# Altium footprint library 总库.PcbLib: 264 footprints (part 1 of 17)
Each footprint in its own frame and in the unit in brackets; x right, y up, seen from the top. Pads: shape width x height; smd on the part's side, far side on the other; paste and mask are expansions set on the pad; w line width, h text height; cw(c..) or ccw(c..) is an arc to the next point about the centre after c.
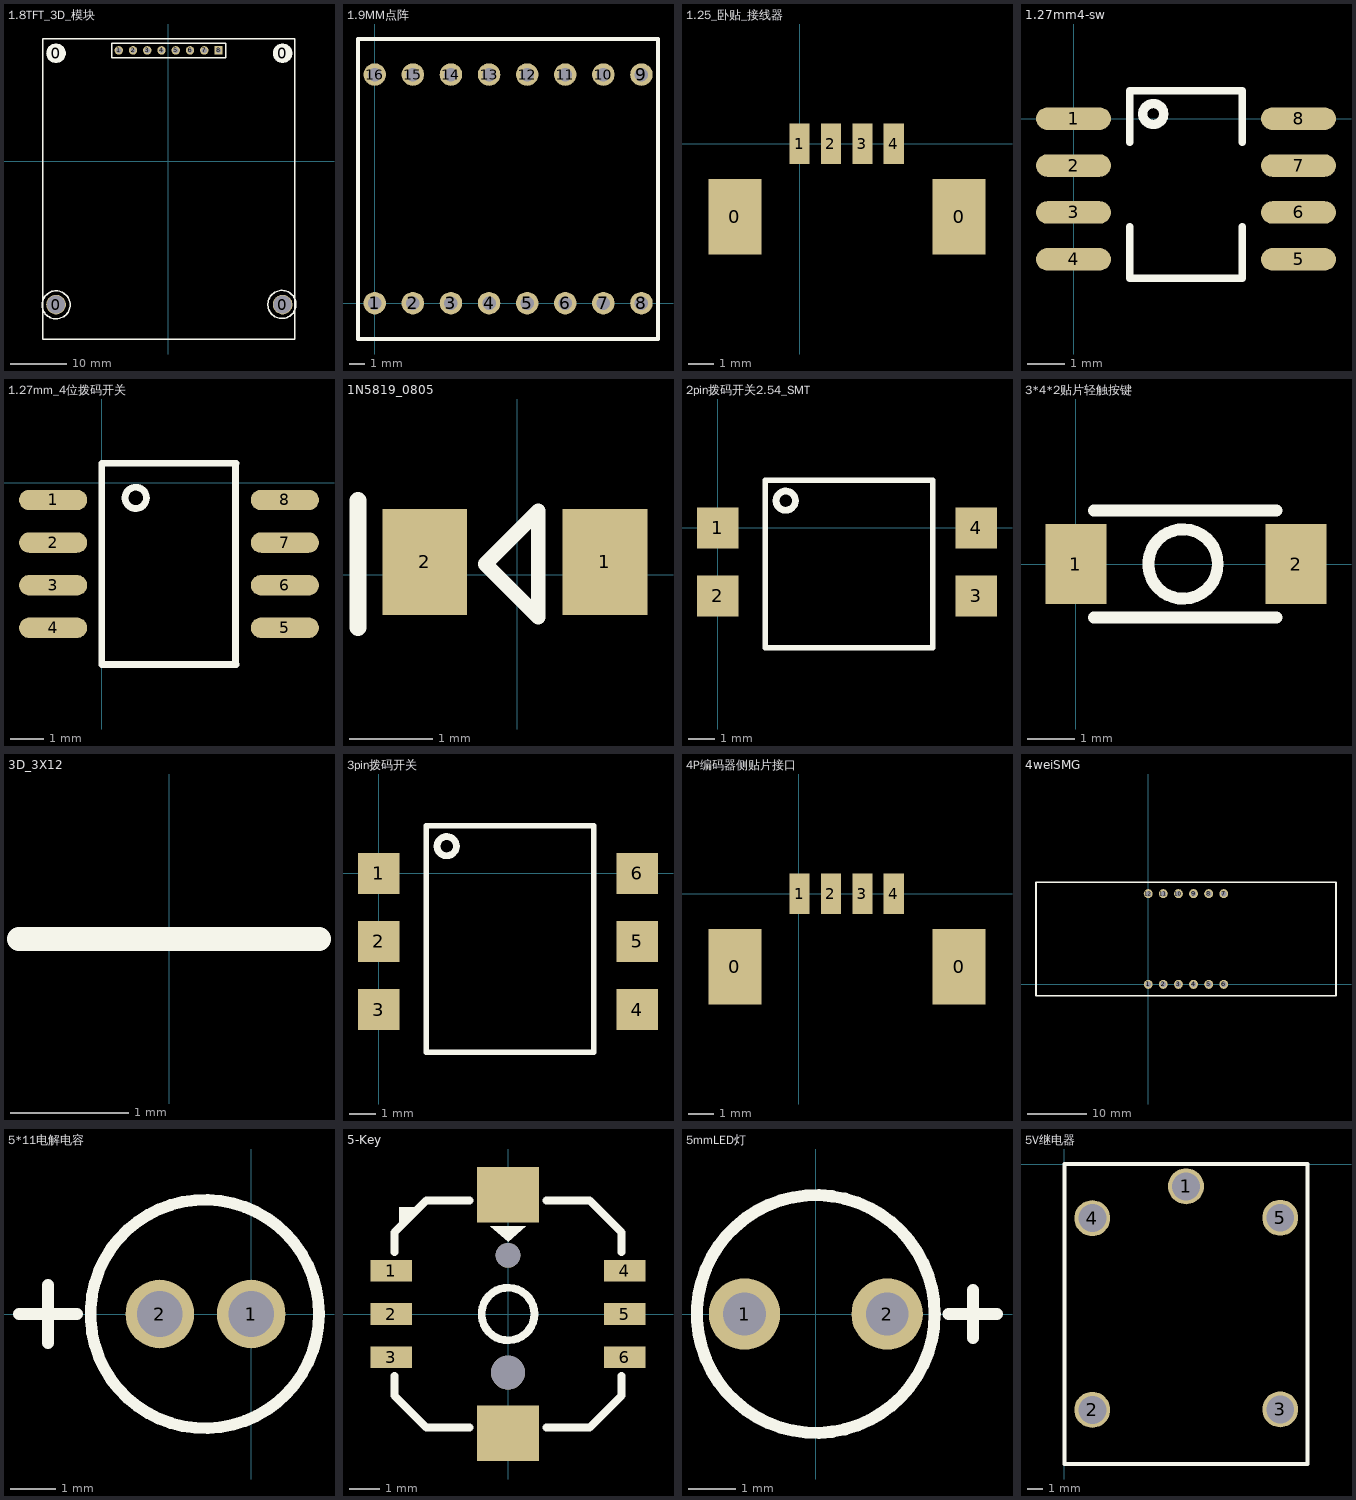
[diagram p0: the footprints below, top view; thin cyan lines are the x and y axes]

## 1.8TFT_3D_模块 [mm]
pads (12):
  round 3.5 hole 3.2: 0(-19.964,-25.572) 0(20.426,-25.572)
  round 3.5 on Top Overlay: 0(-19.964,19.228) 0(20.426,19.228)
  round 1.5 hole 0.9: 1(-8.788,19.736) 2(-6.248,19.736) 3(-3.708,19.736) 4(-1.168,19.736) 5(1.372,19.736) 6(3.912,19.736) 7(6.452,19.736)
  rect 1.5x1.5 hole 0.9: 8(8.992,19.736)
Top Overlay:
  circle w0.254: c20.295,-25.54 r2.5
  circle w0.254: c-19.964,-25.616 r2.5
  lines w0.254: -22.377,-31.702 -22.377,21.768 22.583,21.768 22.583,-31.702 -22.377,-31.702 ; -10.058,18.466 -10.058,21.006 10.262,21.006 10.262,18.466 -10.058,18.466
3D body: height 7.06, standoff 0.06, extent 17.715,-27.805 22.911,-23.305
3D body: height 10.5, standoff 4.13, extent 17.495,-28.34 23.095,-22.74
3D body: height 10.11, standoff -1.43, extent 5.156,18.44 10.236,20.93
3D body: height 10.11, standoff -1.43, extent 0.076,18.44 5.156,20.93
3D body: height 10.11, standoff -1.43, extent -5.004,18.44 0.076,20.93
3D body: height 10.11, standoff -1.43, extent -10.084,18.44 -5.004,20.93
3D body: height 9.27, standoff 7.87, extent -10.058,18.466 10.261,21.005
3D body: height 7.87, standoff 7.11, extent -22.504,-31.829 22.71,21.895
3D body: height 9.14, standoff 7.87, extent -16.916,-28.27 17.338,17.814
3D body: height 9.27, standoff 7.87, extent -1.795,-26.365 2.253,-22.309
3D body: height 9.27, standoff 7.87, extent -14.503,-19.761 15.087,15.671
3D body: height 10.5, standoff 4.13, extent -22.764,-28.416 -17.164,-22.816
3D body: height 7.06, standoff 0.06, extent -22.544,-27.881 -17.348,-23.381

## 1.9MM点阵 [mm]
pads (16):
  round 1.5 hole 0.9: 1(0,0) 2(2.54,0) 3(5.08,0) 4(7.62,0) 5(10.16,0) 6(12.7,0) 7(15.24,0) 8(17.78,0) 9(17.78,15.24) 10(15.24,15.24) 11(12.7,15.24) 12(10.16,15.24) 13(7.62,15.24) 14(5.08,15.24) 15(2.54,15.24) 16(0,15.24)
Top Overlay:
  lines w0.254: -1.118,-2.388 18.882,-2.388 18.882,17.612 -1.118,17.612 -1.118,-2.388
3D body: height 6, standoff -5, extent -1.245,-2.515 18.755,17.485

## 1.25_卧贴_接线器 [mm]
pads (6):
  rect 2.1x3 smd: 0(-2.565,-2.896) 0(6.325,-2.896)
  rect 0.8x1.6 smd: 1(0,0) 2(1.245,0) 3(2.489,0) 4(3.734,0)
3D body: height 3.22, standoff -0.18, extent -3.221,-4.623 6.929,0.577

## 1.27mm4-sw [mil]
pads (8):
  oval 80x24 smd: 1(0,0) 2(0,-50) 3(0,-100) 4(0,-150) 5(240,-150) 6(240,-100) 7(240,-50) 8(240,0)
Top Overlay:
  circle w10: c85,5 r11.18
  lines w8: 60,-115 60,-170 180,-170 180,-115 ; 60,-25 60,30 180,30 180,-25
3D body: height 59.06, standoff 0, extent -17.34,-198.43 257.34,50

## 1.27mm_4位拨码开关 [mil]
pads (8):
  oval 80x24 smd: 1(-57,-20) 2(-57,-70) 3(-57,-120) 4(-57,-170) 5(215,-170) 6(215,-120) 7(215,-70) 8(215,-20)
Top Overlay:
  circle w8: c40,-17.5 r12.5
  lines w8: 0,-213.22 0,23 157.48,23 ; 0,-213 158,-213 ; 157,-213.22 157,23
3D body: height 59.06, standoff 0, extent -57.34,-220 217.34,28.43

## 1N5819_0805 [mil]
pads (2):
  rect 40x50 smd: 1(41.5,6) 2(-43.5,6)
Top Overlay:
  lines w7: -15,5 10,30 10,-20 -15,5
  lines w8: -75,-25 -75,35
3D body: height 30.39, standoff -0.39, extent -40.5,-18.61 38.24,30.61

## 2pin拨码开关2.54_SMT [mm]
pads (4):
  rect 1.54x1.54 smd: 1(0,0) 2(0,-2.54) 3(9.652,-2.54) 4(9.652,0)
Top Overlay:
  circle w0.254: c2.54,1.016 r0.359
  lines w0.203: 1.778,-4.47 1.778,1.778 8.028,1.778 8.028,-4.47 1.778,-4.47
3D body: height 4.45, standoff 0, extent 0.125,-4.902 9.195,2.158

## 3*4*2贴片轻触按键 [mm]
pads (2):
  rect 1.3x1.7 smd: 1(0,0) 2(4.699,0)
Top Overlay:
  circle w0.254: c2.286,0 r0.741
  lines w0.254: 0.381,-1.143 4.281,-1.143 ; 0.381,1.143 4.281,1.143
3D body: height 1.5, standoff 0, extent 0.382,-1.142 4.28,1.142
3D body: height 0.25, standoff 0, extent -0.118,-0.6 0.38,0.634
3D body: height 0.25, standoff 0, extent 4.282,-0.6 4.78,0.634
3D body: height 2, standoff 0, extent 1.54,-0.746 3.032,0.746

## 3D_3X12 [mm]
Top Layer:
  lines w0.152: -1.245,29.21 0.838,29.21
Top Overlay:
  lines w0.2: -1.27,29.21 1.27,29.21
3D body: height 7.62, standoff -2.62, extent -10.092,-1.27 5.368,1.27
3D body: height 7.62, standoff -2.62, extent -10.092,1.27 5.368,3.81
3D body: height 7.62, standoff -2.62, extent -10.092,3.81 5.368,6.35
3D body: height 7.62, standoff -2.62, extent -10.092,6.35 5.368,8.89
3D body: height 7.62, standoff -2.62, extent -10.092,8.89 5.368,11.43
3D body: height 7.62, standoff -2.62, extent -10.092,11.43 5.368,13.97
3D body: height 7.62, standoff -2.62, extent -10.092,13.97 5.368,16.51
3D body: height 7.62, standoff -2.62, extent -10.092,16.51 5.368,19.05
3D body: height 7.62, standoff -2.62, extent -10.092,19.05 5.368,21.59
3D body: height 7.62, standoff -2.62, extent -10.092,21.59 5.368,24.13
3D body: height 7.62, standoff -2.62, extent -10.092,24.13 5.368,26.67
3D body: height 7.62, standoff -2.62, extent -10.092,26.67 5.368,29.21

## 3pin拨码开关 [mm]
pads (6):
  rect 1.54x1.54 smd: 1(0,0) 2(0,-2.54) 3(0,-5.08) 4(9.652,-5.08) 5(9.652,-2.54) 6(9.652,0)
Top Overlay:
  circle w0.254: c2.54,1.016 r0.359
  lines w0.203: 1.778,-6.672 1.778,1.778 8.028,1.778 8.028,-6.672 1.778,-6.672
3D body: height 4.45, standoff 0, extent 0.125,-4.902 9.195,2.158

## 4P编码器侧贴片接口 [mm]
pads (6):
  rect 2.1x3 smd: 0(-2.54,-2.896) 0(6.35,-2.896)
  rect 0.8x1.6 smd: 1(0.025,0) 2(1.27,0) 3(2.515,0) 4(3.759,0)
3D body: height 3.22, standoff -0.18, extent -3.195,-4.623 6.955,0.577

## 4weiSMG [mm]
pads (12):
  round 1.5 hole 0.9: 1(0,0) 2(2.54,0) 3(5.08,0) 4(7.62,0) 5(10.16,0) 6(12.7,0) 7(12.7,15.24) 8(10.16,15.24) 9(7.62,15.24) 10(5.08,15.24) 11(2.54,15.24) 12(0,15.24)
Top Overlay:
  lines w0.254: -18.847,-1.88 -18.847,17.12 31.553,17.12 31.553,-1.88 -18.847,-1.88
3D body: height 8, standoff -3.5, extent -18.821,-1.855 31.479,17.145

## 5*11电解电容 [mm]
pads (2):
  round 1.5 hole 1: 1(0,0) 2(-2,0)
Top Overlay:
  circle w0.254: c-1.016,0 r2.5
  lines w0.254: -5.08,0 -3.81,0 ; -4.445,-0.635 -4.445,0.635

## 5-Key [mm]
pads (10):
  rect 1.35x0.7 smd: 1(-3.785,1.397) 2(-3.785,0) 3(-3.785,-1.397) 4(3.785,1.397) 5(3.785,0) 6(3.785,-1.397)
  rect 2x1.8 smd: ""(0,-3.861) ""(0,3.861)
  round 1.1 hole 1.1: ""(0,-1.9)
  round 0.8 hole 0.8: ""(0,1.9)
Top Overlay:
  circle w0.254: c0,0 r0.854
  region: -3.531,2.832 -3.531,3.467 -2.946,3.467 -2.921,3.442
  region: -0.572,2.845 0.572,2.845 0,2.337
  lines w0.254: -3.683,-2.007 -3.683,-2.642 -2.642,-3.683 -1.245,-3.683 ; -3.683,2.007 -3.683,2.642 -2.642,3.683 -1.245,3.683 ; 1.245,-3.683 2.642,-3.683 3.683,-2.642 3.683,-2.007 ; 1.245,3.683 2.642,3.683 3.683,2.642 3.683,2.007
3D body: height 5, standoff -0.5, extent -3.81,-3.81 3.673,3.69

## 5mmLED灯 [mm]
pads (2):
  round 1.5 hole 0.9: 1(-1.5,0) 2(1.5,0)
Top Overlay:
  circle w0.254: c0,0 r2.5
  lines w0.254: 2.794,0 3.81,0 ; 3.302,-0.508 3.302,0.508

## 5V继电器 [mil]
pads (5):
  round 90 hole 70: 1(304.88,-55.94) 2(70,-616.14) 3(541.1,-615) 4(70,-135.83) 5(541.1,-134.69)
Top Overlay:
  lines w10: -0.24,-751.97 610,-751.97 610,0 -0.24,0 -0.24,-751.97
3D body: height 607.36, standoff -191.85, extent -0.24,-750.98 609.99,0.99